# Altium footprint library myPcbLib2.PcbLib: 56 footprints (part 4 of 4)
Each footprint in its own frame and in the unit in brackets; x right, y up, seen from the top. Pads: shape width x height; smd on the part's side, far side on the other; paste and mask are expansions set on the pad; w line width, h text height; cw(c..) or ccw(c..) is an arc to the next point about the centre after c.
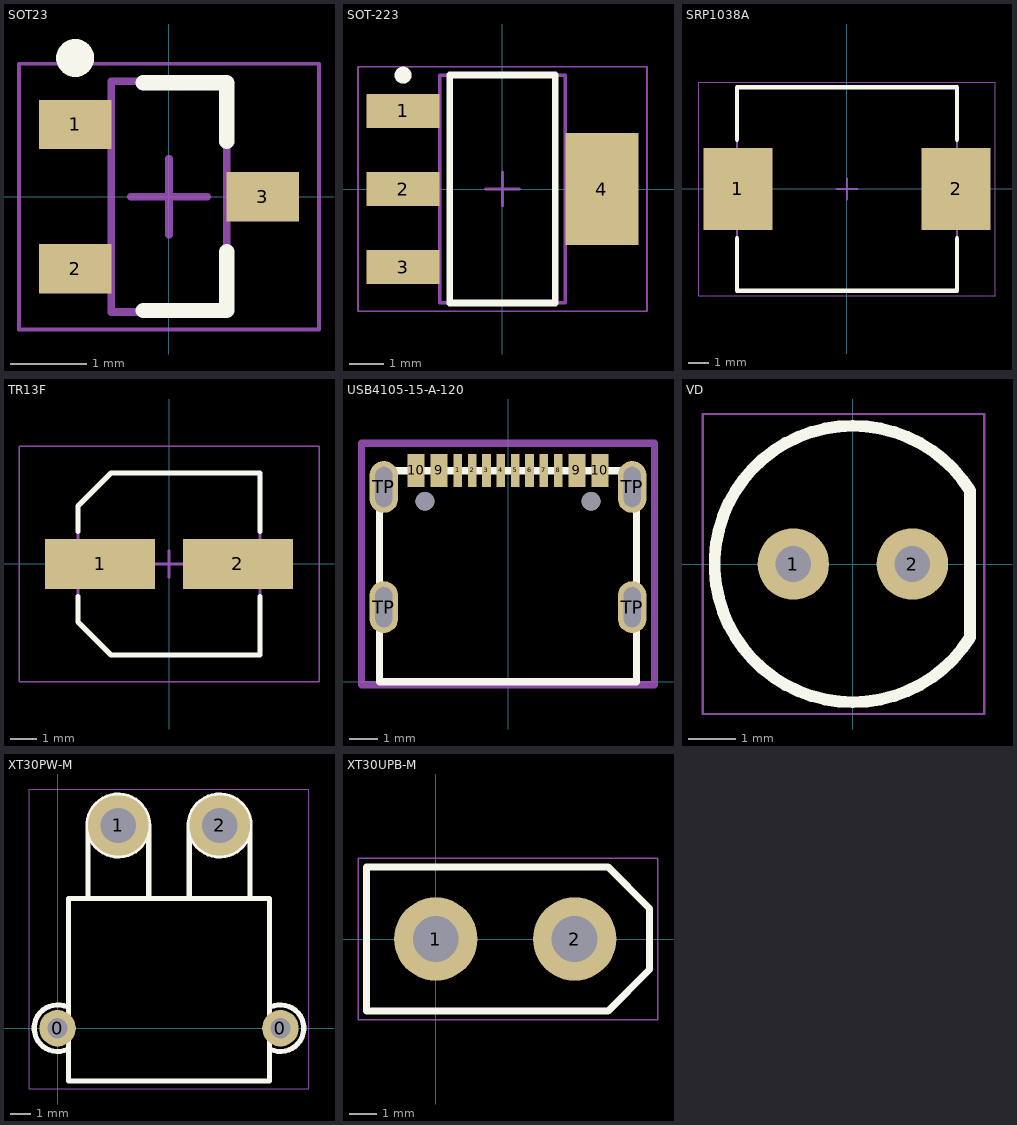
[diagram p3: the footprints below, top view; thin cyan lines are the x and y axes]

## SOT23 [mm] "mosfet"
height 1.12
pads (3):
  rect 0.95x0.65 smd: 1(-1.235,0.95) 2(-1.235,-0.95) 3(1.235,0)
Top Overlay:
  circle w0.25: c-1.235,1.825 r0.125
  lines w0.2: -0.34,-1.5 0.76,-1.5 0.76,-0.725 ; -0.34,1.5 0.76,1.5 0.76,0.725
Top Mechanical 9/Mechanical 10:
  text ".Designator" at -2.198,3.316 h1.52
  text ".Comment" at -2.198,2.156 h1.52
Top Mechanical 13/Mechanical 14:
  lines w0.1: -0.76,-1.52 -0.76,1.52 0.76,1.52 0.76,-1.52 -0.76,-1.52
Mechanical 15:
  lines w0.05: -1.975,-1.75 -1.975,1.75 1.975,1.75 1.975,-1.75 -1.975,-1.75
  lines w0.1: -0.5,0 0.5,0 ; 0,-0.5 0,0.5
3D body "CircuitWorks-SOT-23.step": height 1.05, standoff -0.05, extent -1.25,-1.5 1.25,1.5

## SOT-223 [mm] "MC33269"
height 1.75
pads (4):
  rect 2.15x1 smd: 1(-2.925,2.3) 2(-2.925,0) 3(-2.925,-2.3)
  rect 2.15x3.3 smd: 4(2.925,0)
Top Overlay:
  circle w0.25: c-2.925,3.35 r0.125
  lines w0.2: -1.55,-3.35 -1.55,3.35 1.55,3.35 1.55,-3.35 -1.55,-3.35
Top Mechanical 9/Mechanical 10:
  text ".Comment" at -0.919,2.473 h1.52
  text ".Designator" at 0.241,2.473 h1.52
Top Mechanical 13/Mechanical 14:
  lines w0.1: -1.85,-3.35 -1.85,3.35 1.85,3.35 1.85,-3.35 -1.85,-3.35
Mechanical 15:
  lines w0.05: -4.25,-3.6 -4.25,3.6 4.25,3.6 4.25,-3.6 -4.25,-3.6
  lines w0.1: -0.5,0 0.5,0 ; 0,-0.5 0,0.5
3D body "CircuitWorks-SOT-223.step": height 1.65, standoff -0.03, extent -3.48,-3.25 3.48,3.25

## SRP1038A [mm] "SRP1038A-4R7M"
height 4
pads (2):
  rect 3.3x3.9 smd: 1(-5.2,0) 2(5.2,0)
Top Overlay:
  lines w0.2: -5.25,-2.35 -5.25,-4.85 5.25,-4.85 5.25,-2.35 ; -5.25,2.35 -5.25,4.85 5.25,4.85 5.25,2.35
Top Mechanical 9/Mechanical 10:
  text ".Designator" at -2.523,0.316 h1.52
  text ".Comment" at -2.523,-0.844 h1.52
Top Mechanical 13/Mechanical 14:
  lines w0.1: -5.25,-4.85 -5.25,4.85 5.25,4.85 5.25,-4.85 -5.25,-4.85
Mechanical 15:
  lines w0.05: -7.075,-5.1 -7.075,5.1 7.075,5.1 7.075,-5.1 -7.075,-5.1
  lines w0.1: -0.5,0 0.5,0 ; 0,-0.5 0,0.5
3D body "User Library-Bourns_SRP1038A_series_CASE-Non-Lead-Frame.step": height 4, standoff 0, extent -5.5,-5.15 5.5,5.15

## TR13F [mm] "Aluminum Electrolytic Capacitor, Body 6,60x6,60x6,30mm, IPC Low Density"
height 6.3
pads (2):
  rect 4.1x1.85 smd: 1(-2.575,0) 2(2.575,0)
Top Overlay:
  lines w0.2: -3.4,-1.225 -3.4,-2.163 -2.163,-3.4 3.4,-3.4 3.4,-1.225 ; -3.4,1.225 -3.4,2.163 -2.163,3.4 3.4,3.4 3.4,1.225
Top Mechanical 9/Mechanical 10:
  text ".Designator" at -2.148,2.316 h1.52
  text ".Comment" at -2.148,1.156 h1.52
Top Mechanical 13/Mechanical 14:
  lines w0.1: -3.4,-2.163 -2.163,-3.4 3.4,-3.4 3.4,3.4 -2.163,3.4 -3.4,2.163 -3.4,-2.163
Mechanical 15:
  lines w0.05: -5.6,-4.4 -5.6,4.4 5.6,4.4 5.6,-4.4 -5.6,-4.4
  lines w0.1: -0.5,0 0.5,0 ; 0,-0.5 0,0.5
3D body "User Library-capacitor size D.step": height 5.41, standoff -0.01, extent -3.5,-3.3 3.5,3.3

## USB4105-15-A-120 [mm] "USB Type-c 16p USB4105-15-A-120"
pads (18):
  rect 0.3x1.15 smd: 1(-1.75,7.355) 2(-1.25,7.355) 3(-0.75,7.355) 4(-0.25,7.355) 5(0.25,7.355) 6(0.75,7.355) 7(1.25,7.355) 8(1.75,7.355)
  rect 0.6x1.15 smd: 9(-2.4,7.355) 9(2.4,7.355) 10(-3.2,7.355) 10(3.2,7.355)
  oval 1x1.8 hole 0.6 slot 1.4 at 90 deg: TP(-4.32,2.6) TP(-4.32,6.78) TP(4.32,2.6) TP(4.32,6.78)
  round 0.65 hole 0.65 unplated: ""(-2.89,6.28) ""(2.89,6.28)
Top Overlay:
  lines w0.254: -4.47,0 4.47,0 4.47,7.35 -4.47,7.35 -4.47,0
Top Mechanical 9/Mechanical 10:
  text ".Comment" at -2.523,2.856 h1.52
  text ".Designator" at -2.523,4.016 h1.52
Mechanical 15:
  lines w0.254: -5.1,-0.1 5.1,-0.1 5.1,8.3 -5.1,8.3 -5.1,-0.1
3D body "USB4105-15-A-120.stp": height 3.26, standoff -1.2, extent -4.47,0 4.47,7.7

## VD [mil]
pads (2):
  round 60 hole 30: 1(-50,0) 2(50,0)
Top Overlay:
  lines w10: 98.49,-61.55 cw(c0,0) 98.49,61.55 98.49,-61.55
Bottom Mechanical 7/Mechanical 8:
  text ".Designator" at -100.33,60.66 h60
  text ".Comment" at -100.33,15 h60
Mechanical 15:
  lines w1.97: -125.98,-125.98 110.24,-125.98 110.24,125.99 -125.98,125.99 -125.98,-125.98
3D body "SW3DPS-5MM LED RED-DEFAULT.X_T": height 338.58, standoff -196.85, extent -100.26,-100.39 100.26,100.39

## XT30PW-M [mm]
pads (4):
  round 1.8 hole 1: 0(0,0) 0(11,0)
  round 3 hole 1.75: 1(3,10) 2(8,10)
Top Overlay:
  circle w0.254: c8,10 r1.503
  circle w0.254: c3,10 r1.5
  lines w0.254: 0.486,-1.042 cw(c0,0) 0.486,1.042 ; 1.5,6.4 1.5,10 ; 4.4,10 4.5,10 4.5,6.4 6.5,6.4 6.5,10 ; 9.5,6.4 9.5,10 9.503,10 ; 10.514,-1.042 ccw(c11,0) 10.514,1.042 ; 0.55,-2.6 10.45,-2.6 10.45,6.4 0.55,6.4 0.55,-2.6
Top Mechanical 9/Mechanical 10:
  text ".Designator" at 2.977,1.716 h1.52
  text ".Comment" at 2.977,0.556 h1.52
Mechanical 15:
  lines w0.05: -1.4,-3 12.4,-3 12.4,11.8 -1.4,11.8 -1.4,-3
3D body "User Library-XT30PW-M.step": height 5, standoff -2, extent -1.15,-2.95 12.15,11

## XT30UPB-M [mm]
pads (2):
  round 3 hole 1.65: 1(0,0) 2(5,0)
Top Overlay:
  lines w0.254: 7.7,0.9 7.7,1.1 ; 7.7,1.1 6.2,2.6 -2.5,2.6 -2.5,-2.6 6.2,-2.6 7.7,-1.1 7.7,1.1
Top Mechanical 9/Mechanical 10:
  text ".Designator" at 2.284,-2.623 h1.52
  text ".Comment" at 3.444,-2.623 h1.52
Mechanical 15:
  lines w0.05: -2.8,-2.9 8,-2.9 8,2.9 -2.8,2.9 -2.8,-2.9
3D body "User Library-xt30upb-m.STEP": height 9.4, standoff -2, extent -2.59,-2.595 7.61,2.605